# Altium footprint library Inductors SMD.PcbLib: 145 footprints (part 4 of 10)
Each footprint in its own frame and in the unit in brackets; x right, y up, seen from the top. Pads: shape width x height; smd on the part's side, far side on the other; paste and mask are expansions set on the pad; w line width, h text height; cw(c..) or ccw(c..) is an arc to the next point about the centre after c.
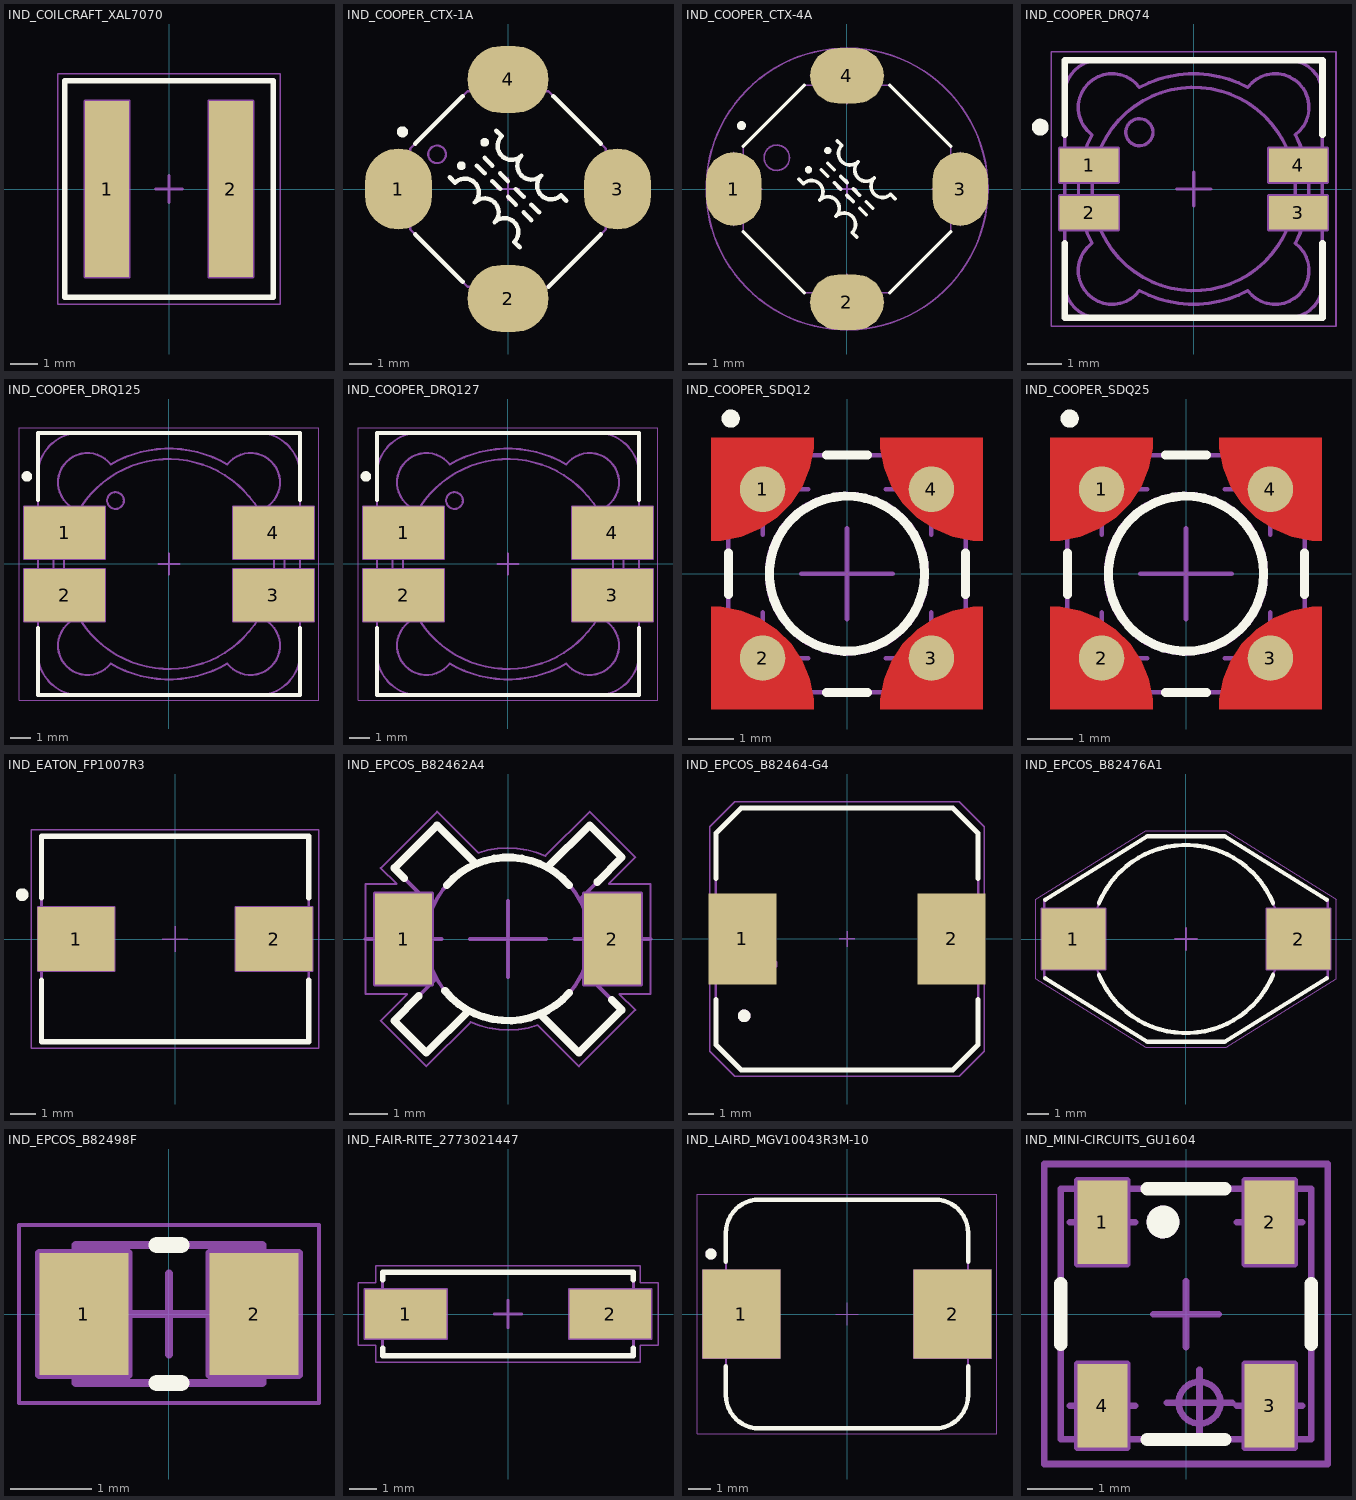
[diagram p3: the footprints below, top view; thin cyan lines are the x and y axes]

## IND_COILCRAFT_XAL7070 [mm] "SMD Inductor Body Width 7.5mm Body Lenght 7.2mm Height 7mm, XAL7070 Series"
height 7
pads (2):
  rect 1.63x6.5 smd: 1(-2.285,0) 2(2.285,0)
Top Overlay:
  lines w0.2: -3.85,-4 3.85,-4 3.85,4 -3.85,4 -3.85,-4
Mechanical 8:
  lines w0.1: -2.785,0 -2.285,0 ; -2.285,-0.5 -2.285,0 ; -2.285,0.5 -2.285,0 ; -1.785,0 -2.285,0 ; -0.5,0 0,0 ; 0,-0.5 0,0 ; 0,0.5 0,0 ; 0.5,0 0,0 ; 1.785,0 2.285,0 ; 2.285,-0.5 2.285,0 ; 2.285,0.5 2.285,0 ; 2.785,0 2.285,0 ; -3.1,-3.25 -3.1,3.25 -1.47,3.25 -1.47,-3.25 -3.1,-3.25 ; 1.47,-3.25 1.47,3.25 3.1,3.25 3.1,-3.25 1.47,-3.25
Mechanical 14:
  lines w0.1: -3.85,-4 3.85,-4 3.85,4 -3.85,4 -3.85,-4
Mechanical 15:
  lines w0.05: -4.1,-4.25 4.1,-4.25 4.1,4.25 -4.1,4.25 -4.1,-4.25
3D body "IND_COILCRAFT_XAL7070.stp": height 7, standoff 0, extent -3.85,-4 3.85,4

## IND_COOPER_CTX-1A [mm] "Dual Winding Shielded Power Inductor/Transformer CTX OCTA-PAC® PLUS Series"
height 4.19
pads (4):
  oval 3.04x3.68 smd: 1(-4.98,0) 3(4.98,0)
  oval 3.68x3.04 smd: 2(0,-4.98) 4(0,4.98)
Top Overlay:
  circle w0.2: c-1.061,2.121 r0.1
  circle w0.2: c-2.121,1.061 r0.1
  circle w0.25: c-4.8,2.6 r0.125
  lines w0.2: -2.652,0.53 -2.408,0.286 cw(c-1.959,-0.163) -1.51,-0.612 cw(c-1.061,-1.061) -0.612,-1.51 cw(c-0.163,-1.959) 0.286,-2.408 0.53,-2.652 ; -1.414,1.061 -1.061,0.707 ; -1.061,1.414 -0.707,1.061 ; -0.707,0.354 -0.354,0 ; -0.53,2.652 -0.286,2.408 ccw(c0.163,1.959) 0.612,1.51 ccw(c1.061,1.061) 1.51,0.612 ccw(c1.959,0.163) 2.408,-0.286 2.652,-0.53 ; -0.354,0.707 0,0.354 ; 0,-0.354 0.354,-0.707 ; 0.354,0 0.707,-0.354 ; 0.707,-1.061 1.061,-1.414 ; 1.061,-0.707 1.414,-1.061 ; -4.225,2.06 -2.06,4.225 -4.225,2.06 ; -4.225,-2.06 -2.06,-4.225 -4.225,-2.06 ; 1.84,-4.445 4.225,-2.06 1.84,-4.445 ; 2.06,4.225 4.225,2.06 2.06,4.225
Mechanical 8:
  lines w0.1: -4.98,0 -5.48,0 -4.98,0 ; -4.98,0 -4.98,0.5 -4.98,0 ; -4.98,0 -4.48,0 -4.98,0 ; -4.98,0 -4.98,-0.5 -4.98,0 ; 0,-4.98 0,-4.48 0,-4.98 ; 0,-4.98 0.5,-4.98 0,-4.98 ; 0,-4.98 0,-5.48 0,-4.98 ; 0,-4.98 -0.5,-4.98 0,-4.98 ; 0,0 0,0.5 0,0 ; 0,0 0.5,0 0,0 ; 0,0 0,-0.5 0,0 ; 0,0 -0.5,0 0,0 ; 0,4.98 0,5.48 0,4.98 ; 0,4.98 0.5,4.98 0,4.98 ; 0,4.98 0,4.48 0,4.98 ; 0,4.98 -0.5,4.98 0,4.98 ; 4.98,0 4.48,0 4.98,0 ; 4.98,0 4.98,0.5 4.98,0 ; 4.98,0 5.48,0 4.98,0 ; 4.98,0 4.98,-0.5 4.98,0
Mechanical 14:
  circle w0.1: c-3.225,1.575 r0.4
  circle w0.1: c-1.061,2.121 r0.1
  circle w0.1: c-2.121,1.061 r0.1
  lines w0.1: -2.652,0.53 -2.408,0.286 cw(c-1.959,-0.163) -1.51,-0.612 cw(c-1.061,-1.061) -0.612,-1.51 cw(c-0.163,-1.959) 0.286,-2.408 0.53,-2.652 ; -1.414,1.061 -1.061,0.707 ; -1.061,1.414 -0.707,1.061 ; -0.707,0.354 -0.354,0 ; -0.53,2.652 -0.286,2.408 ccw(c0.163,1.959) 0.612,1.51 ccw(c1.061,1.061) 1.51,0.612 ccw(c1.959,0.163) 2.408,-0.286 2.652,-0.53 ; -0.354,0.707 0,0.354 ; 0,-0.354 0.354,-0.707 ; 0.354,0 0.707,-0.354 ; 0.707,-1.061 1.061,-1.414 ; 1.061,-0.707 1.414,-1.061 ; -5.715,-0.6 -4.445,-0.6 ; -5.715,-0.6 -5.715,0.6 ; -5.715,-0.6 -4.445,-0.6 ; -5.715,-0.6 -5.715,0.6 ; -5.715,0.6 -4.445,0.6 ; -5.715,0.6 -4.445,0.6 ; -4.445,-1.84 -4.445,1.84 ; -4.445,-1.84 -1.84,-4.445 ; -4.445,-1.84 -4.445,1.84 ; -4.445,-1.84 -1.84,-4.445 ; -4.445,-0.6 -4.445,0.6 ; -4.445,-0.6 -4.445,0.6 ; -4.445,1.84 -1.84,4.445 ; -4.445,1.84 -1.84,4.445 ; -1.84,-4.445 1.84,-4.445 ; -1.84,-4.445 1.84,-4.445 ; -1.84,4.445 1.84,4.445 ; -1.84,4.445 1.84,4.445 ; -0.6,-5.715 -0.6,-4.445 ; -0.6,-5.715 0.6,-5.715 ; -0.6,-5.715 -0.6,-4.445 ; -0.6,-5.715 0.6,-5.715 ; -0.6,-4.445 0.6,-4.445 ; -0.6,-4.445 0.6,-4.445 ; -0.6,4.445 0.6,4.445 ; -0.6,4.445 -0.6,5.715 ; -0.6,4.445 0.6,4.445 ; -0.6,4.445 -0.6,5.715 ; -0.6,5.715 0.6,5.715 ; -0.6,5.715 0.6,5.715 ; 0.6,-5.715 0.6,-4.445 ; 0.6,-5.715 0.6,-4.445 ; 0.6,4.445 0.6,5.715 ; 0.6,4.445 0.6,5.715 ; 1.84,-4.445 4.445,-1.84 ; 1.84,-4.445 4.445,-1.84 ; 1.84,4.445 4.445,1.84 ; 1.84,4.445 4.445,1.84 ; 4.445,-1.84 4.445,1.84 ; 4.445,-1.84 4.445,1.84 ; 4.445,-0.6 5.715,-0.6 ; 4.445,-0.6 4.445,0.6 ; 4.445,-0.6 5.715,-0.6 ; 4.445,-0.6 4.445,0.6 ; 4.445,0.6 5.715,0.6 ; 4.445,0.6 5.715,0.6 ; 5.715,-0.6 5.715,0.6 ; 5.715,-0.6 5.715,0.6
  text "1" at -3.825,-0.575 h1.2
  text "2" at -0.425,-4 h1.2
  text "4" at -0.425,2.75 h1.2
  text "3" at 3.225,-0.65 h1.2
3D body "IND_COOPER_CTX-1A.stp": height 4.19, standoff 0, extent -5.715,-5.715 5.715,5.715

## IND_COOPER_CTX-4A [mm] "Dual Winding Shielded Power Inductor/Transformer CTX OCTA-PAC® PLUS Series"
height 6.35
pads (4):
  oval 3.05x4.06 smd: 1(-6.25,0) 3(6.25,0)
  oval 4.06x3.05 smd: 2(0,-6.25) 4(0,6.25)
Top Overlay:
  circle w0.2: c-1.061,2.121 r0.1
  circle w0.2: c-2.121,1.061 r0.1
  circle w0.25: c-5.825,3.5 r0.125
  lines w0.2: -5.722,-2.36 -2.36,-5.722 ; -5.722,2.36 -2.36,5.722 ; -2.652,0.53 -2.408,0.286 cw(c-1.959,-0.163) -1.51,-0.612 cw(c-1.061,-1.061) -0.612,-1.51 cw(c-0.163,-1.959) 0.286,-2.408 0.53,-2.652 ; -1.414,1.061 -1.061,0.707 ; -1.061,1.414 -0.707,1.061 ; -0.707,0.354 -0.354,0 ; -0.53,2.652 -0.286,2.408 ccw(c0.163,1.959) 0.612,1.51 ccw(c1.061,1.061) 1.51,0.612 ccw(c1.959,0.163) 2.408,-0.286 2.652,-0.53 ; -0.354,0.707 0,0.354 ; 0,-0.354 0.354,-0.707 ; 0.354,0 0.707,-0.354 ; 0.707,-1.061 1.061,-1.414 ; 1.061,-0.707 1.414,-1.061 ; 2.36,-5.722 5.722,-2.36 ; 2.36,5.722 5.722,2.36
Mechanical 8:
  lines w0.1: -7.775,0 -4.725,0 -6.25,0 ; -6.25,-2.03 -6.25,0 ; -6.25,2.03 -6.25,0 ; -2.03,6.25 0,6.25 ; -0.5,0 0,0 ; 0,-7.775 0,-6.25 ; 0,-4.725 0,-6.25 ; 0,-0.5 0,0 ; 0,0.5 0,0 ; 0,4.725 0,6.25 ; 0,7.775 0,6.25 ; 0.5,0 0,0 ; 2.03,-6.25 -2.03,-6.25 0,-6.25 ; 2.03,6.25 0,6.25 ; 4.725,0 6.25,0 ; 6.25,-2.03 6.25,0 ; 6.25,2.03 6.25,0 ; 7.775,0 6.25,0
Mechanical 14:
  circle w0.1: c-3.875,1.725 r0.7
  circle w0.1: c-1.061,2.121 r0.1
  circle w0.1: c-2.121,1.061 r0.1
  lines w0.1: -5.722,-1.18 -7.285,-1.18 -7.285,1.18 -5.722,1.18 ; -2.652,0.53 -2.408,0.286 cw(c-1.959,-0.163) -1.51,-0.612 cw(c-1.061,-1.061) -0.612,-1.51 cw(c-0.163,-1.959) 0.286,-2.408 0.53,-2.652 ; -1.414,1.061 -1.061,0.707 ; -1.18,-5.722 -1.18,-7.285 1.18,-7.285 1.18,-5.722 ; -1.18,5.722 -1.18,7.285 1.18,7.285 1.18,5.722 ; -1.061,1.414 -0.707,1.061 ; -0.707,0.354 -0.354,0 ; -0.53,2.652 -0.286,2.408 ccw(c0.163,1.959) 0.612,1.51 ccw(c1.061,1.061) 1.51,0.612 ccw(c1.959,0.163) 2.408,-0.286 2.652,-0.53 ; -0.354,0.707 0,0.354 ; 0,-0.354 0.354,-0.707 ; 0.354,0 0.707,-0.354 ; 0.707,-1.061 1.061,-1.414 ; 1.061,-0.707 1.414,-1.061 ; 5.722,-1.18 7.285,-1.18 7.285,1.18 5.722,1.18 ; -5.722,-2.36 -2.36,-5.722 2.36,-5.722 5.722,-2.36 5.722,2.36 2.36,5.722 -2.36,5.722 -5.722,2.36 -5.722,-2.36
  text "1" at -3.825,-0.575 h1.2
  text "2" at -0.425,-4 h1.2
  text "4" at -0.425,2.75 h1.2
  text "3" at 3.225,-0.65 h1.2
Mechanical 15:
  circle w0.1: c0,0 r7.775
3D body "IND_COOPER_CTX-4A.stp": height 6.35, standoff 0, extent -7.285,-7.285 7.285,7.285

## IND_COOPER_DRQ74 [mm] "Dual Winding Shielded Inductor/Transformer DRQ Series"
height 4.45
pads (4):
  rect 1.73x1 smd: 1(-3.085,0.7) 2(-3.085,-0.7) 3(3.085,-0.7) 4(3.085,0.7)
Top Overlay:
  circle w0.25: c-4.525,1.825 r0.125
  lines w0.2: -3.8,-1.6 -3.8,-3.8 3.8,-3.8 3.8,-1.6 ; -3.8,1.6 -3.8,3.8 3.8,3.8 3.8,1.6
Mechanical 8:
  lines w0.1: -3.585,-0.7 -3.085,-0.7 ; -3.585,0.7 -3.085,0.7 ; -3.085,-1.2 -3.085,-0.7 ; -3.085,-0.2 -3.085,-0.7 ; -3.085,0.2 -3.085,0.7 ; -3.085,1.2 -3.085,0.7 ; -2.585,-0.7 -3.085,-0.7 ; -2.585,0.7 -3.085,0.7 ; -0.5,0 0,0 ; 0,-0.5 0,0 ; 0,0.5 0,0 ; 0.5,0 0,0 ; 2.585,-0.7 3.085,-0.7 ; 2.585,0.7 3.085,0.7 ; 3.085,-1.2 3.085,-0.7 ; 3.085,-0.2 3.085,-0.7 ; 3.085,0.2 3.085,0.7 ; 3.085,1.2 3.085,0.7 ; 3.585,-0.7 3.085,-0.7 ; 3.585,0.7 3.085,0.7 ; -3.95,-1.2 -3.95,-0.2 -2.22,-0.2 -2.22,-1.2 -3.95,-1.2 ; -3.95,0.2 -3.95,1.2 -2.22,1.2 -2.22,0.2 -3.95,0.2 ; 2.22,-1.2 2.22,-0.2 3.95,-0.2 3.95,-1.2 2.22,-1.2 ; 2.22,0.2 2.22,1.2 3.95,1.2 3.95,0.2 2.22,0.2
Mechanical 14:
  circle w0.1: c-1.6,1.675 r0.4
  circle w0.1: c0,0 r3
  lines w0.1: -3.8,-2.8 ccw(c-2.8,-2.8) -2.8,-3.8 2.8,-3.8 ccw(c2.8,-2.8) 3.8,-2.8 3.8,2.8 ccw(c2.8,2.8) 2.8,3.8 -2.8,3.8 ccw(c-2.8,2.8) -3.8,2.8 -3.8,-2.8 ; -3,-1.601 cw(c0,0) -3,1.601 cw(c-2.404,2.404) -1.601,3 cw(c0,0) 1.601,3 cw(c2.404,2.404) 3,1.601 cw(c0,0) 3,-1.601 cw(c2.404,-2.404) 1.601,-3 cw(c0,0) -1.601,-3 cw(c-2.404,-2.404) -3,-1.601
Mechanical 15:
  lines w0.05: -4.2,-4.05 4.2,-4.05 4.2,4.05 -4.2,4.05 -4.2,-4.05
3D body "IND_COOPER_DRQ74.stp": height 4.45, standoff 0, extent -3.8,-3.8 3.8,3.8

## IND_COOPER_DRQ125 [mm] "Dual Winding Shielded Inductor/Transformer DRQ Series"
height 6
pads (4):
  rect 3.85x2.5 smd: 1(-4.975,1.5) 2(-4.975,-1.5) 3(4.975,-1.5) 4(4.975,1.5)
Top Overlay:
  circle w0.25: c-6.775,4.175 r0.125
  lines w0.2: -6.25,-3.05 -6.25,-6.25 6.25,-6.25 6.25,-3.05 ; -6.25,3.05 -6.25,6.25 6.25,6.25 6.25,3.05
Mechanical 8:
  lines w0.1: -5.475,-1.5 -4.975,-1.5 ; -5.475,1.5 -4.975,1.5 ; -4.975,-2 -4.975,-1.5 ; -4.975,-1 -4.975,-1.5 ; -4.975,1 -4.975,1.5 ; -4.975,2 -4.975,1.5 ; -4.475,-1.5 -4.975,-1.5 ; -4.475,1.5 -4.975,1.5 ; -0.5,0 0,0 ; 0,-0.5 0,0 ; 0,0.5 0,0 ; 0.5,0 0,0 ; 4.475,1.5 4.975,1.5 ; 4.975,1 4.975,1.5 ; 4.975,2 4.975,1.5 ; 5.475,1.5 4.975,1.5 ; -6.9,-2.75 -3.05,-2.75 -3.05,-0.25 -6.9,-0.25 -6.9,-2.75 ; -6.9,0.25 -3.05,0.25 -3.05,2.75 -6.9,2.75 -6.9,0.25 ; 3.05,-2.75 6.9,-2.75 6.9,-0.25 3.05,-0.25 3.05,-2.75 ; 3.05,0.25 6.9,0.25 6.9,2.75 3.05,2.75 3.05,0.25
Mechanical 14:
  circle w0.1: c0,0 r5
  circle w0.1: c-2.55,3.025 r0.4
  lines w0.1: -4.25,6.25 ccw(c-4.25,4.25) -6.25,4.25 -6.25,-4.25 ccw(c-4.25,-4.25) -4.25,-6.25 4.25,-6.25 ccw(c4.25,-4.25) 6.25,-4.25 6.25,4.25 ccw(c4.25,4.25) 4.25,6.25 ; -4.25,6.25 4.25,6.25 ; -4.25,6.25 4.25,6.25 ; -4.745,-2.781 ccw(c-3.889,-3.889) -2.781,-4.745 ccw(c0,0) 2.781,-4.745 ccw(c3.889,-3.889) 4.745,-2.781 ccw(c0,0) 4.745,2.781 ccw(c3.889,3.889) 2.781,4.745 ccw(c0,0) -2.781,4.745 ccw(c-3.889,3.889) -4.745,2.781 ccw(c0,0) -4.745,-2.781
Mechanical 15:
  lines w0.05: -7.15,-6.5 7.15,-6.5 7.15,6.5 -7.15,6.5 -7.15,-6.5
3D body "IND_COOPER_DRQ125.stp": height 6, standoff 0, extent -6.25,-6.25 6.25,6.25

## IND_COOPER_DRQ127 [mm] "Dual Winding Shielded Inductor/Transformer DRQ Series"
height 8
pads (4):
  rect 3.85x2.5 smd: 1(-4.975,1.5) 2(-4.975,-1.5) 3(4.975,-1.5) 4(4.975,1.5)
Top Overlay:
  circle w0.25: c-6.775,4.175 r0.125
  lines w0.2: -6.25,-3.05 -6.25,-6.25 6.25,-6.25 6.25,-3.05 ; -6.25,3.05 -6.25,6.25 6.25,6.25 6.25,3.05
Mechanical 8:
  lines w0.1: -5.475,-1.5 -4.975,-1.5 ; -5.475,1.5 -4.975,1.5 ; -4.975,-2 -4.975,-1.5 ; -4.975,-1 -4.975,-1.5 ; -4.975,1 -4.975,1.5 ; -4.975,2 -4.975,1.5 ; -4.475,-1.5 -4.975,-1.5 ; -4.475,1.5 -4.975,1.5 ; -0.5,0 0,0 ; 0,-0.5 0,0 ; 0,0.5 0,0 ; 0.5,0 0,0 ; 4.475,1.5 4.975,1.5 ; 4.975,1 4.975,1.5 ; 4.975,2 4.975,1.5 ; 5.475,1.5 4.975,1.5 ; -6.9,-2.75 -3.05,-2.75 -3.05,-0.25 -6.9,-0.25 -6.9,-2.75 ; -6.9,0.25 -3.05,0.25 -3.05,2.75 -6.9,2.75 -6.9,0.25 ; 3.05,-2.75 6.9,-2.75 6.9,-0.25 3.05,-0.25 3.05,-2.75 ; 3.05,0.25 6.9,0.25 6.9,2.75 3.05,2.75 3.05,0.25
Mechanical 14:
  circle w0.1: c0,0 r5
  circle w0.1: c-2.55,3.025 r0.4
  lines w0.1: -4.25,6.25 ccw(c-4.25,4.25) -6.25,4.25 -6.25,-4.25 ccw(c-4.25,-4.25) -4.25,-6.25 4.25,-6.25 ccw(c4.25,-4.25) 6.25,-4.25 6.25,4.25 ccw(c4.25,4.25) 4.25,6.25 ; -4.25,6.25 4.25,6.25 ; -4.25,6.25 4.25,6.25 ; -4.745,-2.781 ccw(c-3.889,-3.889) -2.781,-4.745 ccw(c0,0) 2.781,-4.745 ccw(c3.889,-3.889) 4.745,-2.781 ccw(c0,0) 4.745,2.781 ccw(c3.889,3.889) 2.781,4.745 ccw(c0,0) -2.781,4.745 ccw(c-3.889,3.889) -4.745,2.781 ccw(c0,0) -4.745,-2.781
Mechanical 15:
  lines w0.05: -7.15,-6.5 7.15,-6.5 7.15,6.5 -7.15,6.5 -7.15,-6.5
3D body "IND_COOPER_DRQ127.stp": height 8, standoff 0, extent -6.25,-6.25 6.25,6.25

## IND_COOPER_SDQ12 [mm] "Low-Profile Dual Winding Shielded Inductor/Transformer SDQ Series"
height 1.2
pads (4):
  round 1 smd: 1(-1.85,1.85) 2(-1.85,-1.85) 3(1.85,-1.85) 4(1.85,1.85)
Top Layer:
  region: -2.975,-2.975 -0.725,-2.975 -0.725,-2.753 -0.811,-2.319 -0.981,-1.909 -1.227,-1.541 -1.541,-1.227 -1.909,-0.981 -2.319,-0.811 -2.753,-0.725 -2.975,-0.725
  region: 2.975,2.975 0.725,2.975 0.725,2.753 0.811,2.319 0.981,1.909 1.227,1.541 1.541,1.227 1.909,0.981 2.319,0.811 2.753,0.725 2.975,0.725
  region: 2.975,-2.975 2.975,-0.725 2.753,-0.725 2.319,-0.811 1.909,-0.981 1.541,-1.227 1.227,-1.541 0.981,-1.909 0.811,-2.319 0.725,-2.753 0.725,-2.975
  region: -2.975,2.975 -2.975,0.725 -2.753,0.725 -2.319,0.811 -1.909,0.981 -1.541,1.227 -1.227,1.541 -0.981,1.909 -0.811,2.319 -0.725,2.753 -0.725,2.975
Top Overlay:
  circle w0.2: c0,0 r1.7
  circle w0.2: c-2.55,3.4 r0.1
  lines w0.2: -2.6,-0.453 -2.6,0.453 ; -0.453,-2.6 0.453,-2.6 ; -0.453,2.6 0.453,2.6 ; 2.6,-0.453 2.6,0.453
Top Paste:
  region: -2.975,2.975 -2.975,0.725 -2.753,0.725 -2.319,0.811 -1.909,0.981 -1.541,1.227 -1.227,1.541 -0.981,1.909 -0.811,2.319 -0.725,2.753 -0.725,2.975
  region: 2.975,2.975 0.725,2.975 0.725,2.753 0.811,2.319 0.981,1.909 1.227,1.541 1.541,1.227 1.909,0.981 2.319,0.811 2.753,0.725 2.975,0.725
  region: -2.975,-2.975 -0.725,-2.975 -0.725,-2.753 -0.811,-2.319 -0.981,-1.909 -1.227,-1.541 -1.541,-1.227 -1.909,-0.981 -2.319,-0.811 -2.753,-0.725 -2.975,-0.725
  region: 2.975,-2.975 2.975,-0.725 2.753,-0.725 2.319,-0.811 1.909,-0.981 1.541,-1.227 1.227,-1.541 0.981,-1.909 0.811,-2.319 0.725,-2.753 0.725,-2.975
Top Solder:
  region: 0.627,-3.075 0.617,-2.831 0.697,-2.35 0.874,-1.895 1.141,-1.486 1.486,-1.141 1.895,-0.874 2.35,-0.697 2.831,-0.617 3.075,-0.627 3.075,-3.075
  region: 3.075,0.627 2.831,0.617 2.35,0.697 1.895,0.874 1.486,1.141 1.141,1.486 0.874,1.895 0.697,2.35 0.617,2.831 0.627,3.075 3.075,3.075
  region: -3.075,-0.627 -2.831,-0.617 -2.35,-0.697 -1.895,-0.874 -1.486,-1.141 -1.141,-1.486 -0.874,-1.895 -0.697,-2.35 -0.617,-2.831 -0.627,-3.075 -3.075,-3.075
  region: -0.627,3.075 -0.617,2.831 -0.697,2.35 -0.874,1.895 -1.141,1.486 -1.486,1.141 -1.895,0.874 -2.35,0.697 -2.831,0.617 -3.075,0.627 -3.075,3.075
Mechanical 8:
  lines w0.1: -2.85,-1.85 -1.85,-1.85 ; -2.85,1.85 -1.85,1.85 ; -1.85,-2.85 -1.85,-1.85 ; -1.85,-0.85 -1.85,-1.85 ; -1.85,0.85 -1.85,1.85 ; -1.85,2.85 -1.85,1.85 ; -1,0 0,0 ; -0.85,-1.85 -1.85,-1.85 ; -0.85,1.85 -1.85,1.85 ; 0,-1 0,0 ; 0,1 0,0 ; 0.85,-1.85 1.85,-1.85 ; 0.85,1.85 1.85,1.85 ; 1,0 0,0 ; 1.85,-2.85 1.85,-1.85 ; 1.85,-0.85 1.85,-1.85 ; 1.85,0.85 1.85,1.85 ; 1.85,2.85 1.85,1.85 ; 2.85,-1.85 1.85,-1.85 ; 2.85,1.85 1.85,1.85
Mechanical 14:
  circle w0.1: c0,0 r1.75
  circle w0.1: c-2.55,3.4 r0.1
  lines w0.1: -2.6,-2.6 -2.6,2.6 2.6,2.6 2.6,-2.6 -2.6,-2.6
3D body "IND_COOPER_SDQ12.stp": height 1.2, standoff 0, extent -2.6,-2.6 2.6,2.6

## IND_COOPER_SDQ25 [mm] "Low-Profile Dual Winding Shielded Inductor/Transformer SDQ Series"
height 2.5
pads (4):
  round 1 smd: 1(-1.85,1.85) 2(-1.85,-1.85) 3(1.85,-1.85) 4(1.85,1.85)
Top Layer:
  region: -2.975,2.975 -2.975,0.725 -2.753,0.725 -2.319,0.811 -1.909,0.981 -1.541,1.227 -1.227,1.541 -0.981,1.909 -0.811,2.319 -0.725,2.753 -0.725,2.975
  region: 2.975,-2.975 2.975,-0.725 2.753,-0.725 2.319,-0.811 1.909,-0.981 1.541,-1.227 1.227,-1.541 0.981,-1.909 0.811,-2.319 0.725,-2.753 0.725,-2.975
  region: 2.975,2.975 0.725,2.975 0.725,2.753 0.811,2.319 0.981,1.909 1.227,1.541 1.541,1.227 1.909,0.981 2.319,0.811 2.753,0.725 2.975,0.725
  region: -2.975,-2.975 -0.725,-2.975 -0.725,-2.753 -0.811,-2.319 -0.981,-1.909 -1.227,-1.541 -1.541,-1.227 -1.909,-0.981 -2.319,-0.811 -2.753,-0.725 -2.975,-0.725
Top Overlay:
  circle w0.2: c-2.55,3.4 r0.1
  circle w0.2: c0,0 r1.7
  lines w0.2: -2.6,-0.453 -2.6,0.453 ; -0.453,-2.6 0.453,-2.6 ; -0.453,2.6 0.453,2.6 ; 2.6,-0.453 2.6,0.453
Top Paste:
  region: 2.975,-2.975 2.975,-0.725 2.753,-0.725 2.319,-0.811 1.909,-0.981 1.541,-1.227 1.227,-1.541 0.981,-1.909 0.811,-2.319 0.725,-2.753 0.725,-2.975
  region: -2.975,-2.975 -0.725,-2.975 -0.725,-2.753 -0.811,-2.319 -0.981,-1.909 -1.227,-1.541 -1.541,-1.227 -1.909,-0.981 -2.319,-0.811 -2.753,-0.725 -2.975,-0.725
  region: 2.975,2.975 0.725,2.975 0.725,2.753 0.811,2.319 0.981,1.909 1.227,1.541 1.541,1.227 1.909,0.981 2.319,0.811 2.753,0.725 2.975,0.725
  region: -2.975,2.975 -2.975,0.725 -2.753,0.725 -2.319,0.811 -1.909,0.981 -1.541,1.227 -1.227,1.541 -0.981,1.909 -0.811,2.319 -0.725,2.753 -0.725,2.975
Top Solder:
  region: -0.627,3.075 -0.617,2.831 -0.697,2.35 -0.874,1.895 -1.141,1.486 -1.486,1.141 -1.895,0.874 -2.35,0.697 -2.831,0.617 -3.075,0.627 -3.075,3.075
  region: -3.075,-0.627 -2.831,-0.617 -2.35,-0.697 -1.895,-0.874 -1.486,-1.141 -1.141,-1.486 -0.874,-1.895 -0.697,-2.35 -0.617,-2.831 -0.627,-3.075 -3.075,-3.075
  region: 3.075,0.627 2.831,0.617 2.35,0.697 1.895,0.874 1.486,1.141 1.141,1.486 0.874,1.895 0.697,2.35 0.617,2.831 0.627,3.075 3.075,3.075
  region: 0.627,-3.075 0.617,-2.831 0.697,-2.35 0.874,-1.895 1.141,-1.486 1.486,-1.141 1.895,-0.874 2.35,-0.697 2.831,-0.617 3.075,-0.627 3.075,-3.075
Mechanical 8:
  lines w0.1: -2.85,-1.85 -1.85,-1.85 ; -2.85,1.85 -1.85,1.85 ; -1.85,-2.85 -1.85,-1.85 ; -1.85,-0.85 -1.85,-1.85 ; -1.85,0.85 -1.85,1.85 ; -1.85,2.85 -1.85,1.85 ; -1,0 0,0 ; -0.85,-1.85 -1.85,-1.85 ; -0.85,1.85 -1.85,1.85 ; 0,-1 0,0 ; 0,1 0,0 ; 0.85,-1.85 1.85,-1.85 ; 0.85,1.85 1.85,1.85 ; 1,0 0,0 ; 1.85,-2.85 1.85,-1.85 ; 1.85,-0.85 1.85,-1.85 ; 1.85,0.85 1.85,1.85 ; 1.85,2.85 1.85,1.85 ; 2.85,-1.85 1.85,-1.85 ; 2.85,1.85 1.85,1.85
Mechanical 14:
  circle w0.1: c-2.55,3.4 r0.1
  circle w0.1: c0,0 r1.75
  lines w0.1: -2.6,-2.6 2.6,-2.6 2.6,2.6 -2.6,2.6 -2.6,-2.6
3D body "IND_COOPER_SDQ25.stp": height 2.5, standoff 0, extent -2.6,-2.6 2.6,2.6

## IND_EATON_FP1007R3 [mm] "High Frequency, High Current Power Inductors, FP1007(R3) Series"
height 7.5
pads (2):
  rect 3x2.5 smd: 1(-3.85,0) 2(3.85,0)
Top Overlay:
  circle w0.25: c-5.95,1.725 r0.125
  lines w0.2: -5.2,-1.6 -5.2,-4 5.2,-4 5.2,-1.6 ; -5.2,1.6 -5.2,4 5.2,4 5.2,1.6
Mechanical 8:
  lines w0.05: -4.35,0 -3.85,0 ; -3.85,-0.5 -3.85,0 ; -3.85,0.5 -3.85,0 ; -3.35,0 -3.85,0 ; -0.5,0 0,0 ; 0,-0.5 0,0 ; 0,0.5 0,0 ; 0.5,0 0,0 ; 3.35,0 3.85,0 ; 3.85,-0.5 3.85,0 ; 3.85,0.5 3.85,0 ; 4.35,0 3.85,0 ; -5.35,-1.25 -2.35,-1.25 -2.35,1.25 -5.35,1.25 -5.35,-1.25 ; 2.35,-1.25 2.35,1.25 5.35,1.25 5.35,-1.25 2.35,-1.25
Mechanical 14:
  lines w0.1: -5.2,-4 -5.2,4 5.2,4 5.2,-4 -5.2,-4
Mechanical 15:
  lines w0.05: -5.6,-4.25 -5.6,4.25 5.6,4.25 5.6,-4.25 -5.6,-4.25
3D body "IND_EATON_FP1007R3.stp": height 7.5, standoff 0, extent -5.2,-4 5.2,4

## IND_EPCOS_B82462A4 [mm] "SMD Inductor Body Width 6mm Body Lenght 6mm Height 3mm"
height 3
pads (2):
  rect 1.5x2.4 smd: 1(-2.75,0) 2(2.75,0)
Top Overlay:
  lines w0.2: -2.731,1.6 -3,1.869 -1.869,3 -0.845,1.977 ; -2.349,-1.501 -3,-2.151 -2.151,-3 -1.036,-1.884 ; -1.66,-1.367 ccw(c0,0) 1.618,-1.416 ; -1.618,1.416 cw(c0,0) 1.618,1.416 ; 0.845,-1.977 1.869,-3 3,-1.869 2.731,-1.6 ; 1.036,1.884 2.151,3 3,2.151 2.349,1.501
Mechanical 8:
  lines w0.1: -3.75,0 -2.75,0 ; -2.75,-1 -2.75,0 ; -2.75,1 -2.75,0 ; -1.75,0 -2.75,0 ; -1,0 0,0 ; 0,-1 0,0 ; 0,1 0,0 ; 1,0 0,0 ; 1.75,0 2.75,0 ; 2.75,-1 2.75,0 ; 2.75,1 2.75,0 ; 3.75,0 2.75,0 ; -3.5,-1.2 -3.5,1.2 -2,1.2 -2,-1.2 -3.5,-1.2 ; 2,-1.2 2,1.2 3.5,1.2 3.5,-1.2 2,-1.2
Mechanical 14:
  circle w0.1: c0,0 r2.15
  lines w0.1: -1.036,-1.884 -2.151,-3 -3,-2.151 -1.884,-1.036 -1.903,-1 -3,-1 -3,1 -2.131,1 -3,1.869 -1.869,3 -0.845,1.977 ; 0.845,-1.977 1.869,-3 3,-1.869 2.131,-1 3,-1 3,1 1.903,1 1.884,1.036 3,2.151 2.151,3 1.036,1.884
Mechanical 15:
  lines w0.05: -3.75,-1.45 -2.652,-1.45 -3.354,-2.151 -2.151,-3.354 -0.986,-2.188 ccw(c0,0) 0.784,-2.268 1.869,-3.354 3.354,-1.869 2.935,-1.45 3.75,-1.45 3.75,1.45 2.652,1.45 3.354,2.151 2.151,3.354 0.986,2.188 ccw(c0,0) -0.784,2.268 -1.869,3.354 -3.354,1.869 -2.935,1.45 -3.75,1.45 -3.75,-1.45
3D body "IND_EPCOS_B82462A4.stp": height 3, standoff 0, extent -3,-3 3,3

## IND_EPCOS_B82464-G4 [mm] "SMD Inductor Body Width 10.4mm Body Lenght 10.4mm Height 4.8mm"
height 4.8
pads (2):
  rect 2.7x3.6 smd: 1(-4.15,0) 2(4.15,0)
Top Overlay:
  circle w0.25: c-4.075,-3.05 r0.125
  lines w0.2: -5.2,-2.4 -5.2,-4.2 -4.2,-5.2 4.2,-5.2 5.2,-4.2 5.2,-2.4 ; -5.2,2.4 -5.2,4.2 -4.2,5.2 4.2,5.2 5.2,4.2 5.2,2.4
Mechanical 14:
  circle w0.25: c-4.075,-3.05 r0.125
  circle w0.25: c-3,-1 r0.125
  lines w0.1: -5.2,-4.2 -4.2,-5.2 4.2,-5.2 5.2,-4.2 5.2,4.2 4.2,5.2 -4.2,5.2 -5.2,4.2 -5.2,-4.2
Mechanical 15:
  lines w0.05: -0.3,0 0.3,0 ; 0,-0.3 0,0.3 ; -5.45,-4.45 -4.45,-5.45 4.45,-5.45 5.45,-4.45 5.45,4.45 4.45,5.45 -4.45,5.45 -5.45,4.45 -5.45,-4.45
3D body "IND_EPCOS_B82464-G4.stp": height 4.9, standoff 0, extent -5.201,-5.201 5.199,5.199

## IND_EPCOS_B82476A1 [mm] "SMD Inductor Body Width 9.4mm Body Lenght 12.95mm Height 5.08mm"
height 5.08
pads (2):
  rect 2.92x2.79 smd: 1(-5.145,0) 2(5.145,0)
Top Overlay:
  lines w0.2: -6.435,-1.795 -1.77,-4.7 1.77,-4.7 6.435,-1.795 ; -6.435,1.795 -1.77,4.7 1.77,4.7 6.435,1.795 ; -3.974,-1.642 ccw(c0,0) 3.974,-1.642 ; -3.974,1.642 cw(c0,0) 3.974,1.642
Mechanical 8:
  lines w0.1: -5.645,0 -5.145,0 ; -5.145,-0.5 -5.145,0 ; -5.145,0.5 -5.145,0 ; -4.645,0 -5.145,0 ; -0.5,0 0,0 ; 0,-0.5 0,0 ; 0,0.5 0,0 ; 0.5,0 0,0 ; 4.645,0 5.145,0 ; 5.145,-0.5 5.145,0 ; 5.145,0.5 5.145,0 ; 5.645,0 5.145,0 ; -6.605,-1.395 -3.685,-1.395 -3.685,1.395 -6.605,1.395 -6.605,-1.395 ; 3.685,-1.395 6.605,-1.395 6.605,1.395 3.685,1.395 3.685,-1.395
Mechanical 14:
  circle w0.1: c0,0 r4.3
  lines w0.1: -6.475,-1.27 -4.108,-1.27 ; -6.475,1.27 -4.108,1.27 ; 4.108,-1.27 6.475,-1.27 ; 4.108,1.27 6.475,1.27 ; -6.475,-1.77 -6.475,1.77 -1.77,4.7 1.77,4.7 6.475,1.77 6.475,-1.77 1.77,-4.7 -1.77,-4.7 -6.475,-1.77
Mechanical 15:
  lines w0.05: -6.855,-1.828 -6.855,1.828 -1.841,4.95 1.842,4.95 6.855,1.828 6.855,-1.828 1.842,-4.95 -1.841,-4.95 -6.855,-1.828
3D body "IND_EPCOS_B82476A1.stp": height 5.08, standoff 0, extent -6.475,-4.7 6.475,4.7

## IND_EPCOS_B82498F [mm] "SMT inductor SIMID 0805-F, Body Width 1.7mm Body Lenght 2.3mm Height 1.4mm"
height 1.4
pads (2):
  rect 1.1x1.5 smd: 1(-1.05,0) 2(1.05,0)
Top Overlay:
  lines w0.2: -0.15,-0.85 0.15,-0.85 ; -0.15,0.85 0.15,0.85
Mechanical 8:
  lines w0.1: -1.55,0 -1.05,0 ; -1.05,-0.5 -1.05,0 ; -1.05,0.5 -1.05,0 ; -0.55,0 -1.05,0 ; -0.5,0 0,0 ; 0,-0.5 0,0 ; 0,0.5 0,0 ; 0.5,0 0,0 ; 0.55,0 1.05,0 ; 1.05,-0.5 1.05,0 ; 1.05,0.5 1.05,0 ; 1.55,0 1.05,0 ; -1.6,-0.75 -1.6,0.75 -0.5,0.75 -0.5,-0.75 -1.6,-0.75 ; 0.5,-0.75 0.5,0.75 1.6,0.75 1.6,-0.75 0.5,-0.75
Mechanical 14:
  lines w0.1: -1.15,-0.85 -1.15,0.85 1.15,0.85 1.15,-0.85 -1.15,-0.85
Mechanical 15:
  lines w0.05: -1.85,-1.1 1.85,-1.1 1.85,1.1 -1.85,1.1 -1.85,-1.1
3D body "IND_EPCOS_B82498F_Part2.stp": height 1.4, standoff 0.6, extent -1.15,-0.85 1.15,0.85
3D body "IND_EPCOS_B82498F_Part1.stp": height 1.2, standoff 0, extent -1,-0.75 1,0.75

## IND_FAIR-RITE_2773021447 [mm] "SMD Ferrite Bead, Body 9.6x3.05mm"
height 3.05
pads (2):
  rect 3x1.8 smd: 1(-3.75,0) 2(3.75,0)
Top Overlay:
  lines w0.2: -4.6,-1.25 -4.6,-1.525 4.6,-1.525 4.6,-1.25 ; -4.6,1.25 -4.6,1.525 4.6,1.525 4.6,1.25
Mechanical 8:
  lines w0.1: -4.25,0 -3.75,0 ; -3.75,-0.5 -3.75,0 ; -3.75,0.5 -3.75,0 ; -3.25,0 -3.75,0 ; -0.5,0 0,0 ; 0,-0.5 0,0 ; 0,0.5 0,0 ; 0.5,0 0,0 ; 3.25,0 3.75,0 ; 3.75,-0.5 3.75,0 ; 3.75,0.5 3.75,0 ; 4.25,0 3.75,0 ; -5.25,-0.9 -2.25,-0.9 -2.25,0.9 -5.25,0.9 -5.25,-0.9 ; 2.25,-0.9 5.25,-0.9 5.25,0.9 2.25,0.9 2.25,-0.9
Mechanical 14:
  lines w0.1: -4.6,-0.635 -4.8,-0.635 -4.8,0.635 -4.6,0.635 ; 4.6,-0.635 4.8,-0.635 4.8,0.635 4.6,0.635 ; -4.6,-1.525 -4.6,1.525 ; -4.6,-1.525 4.6,-1.525 ; -4.6,-1.525 4.6,-1.525 ; -4.6,1.525 4.6,1.525 ; -4.6,1.525 4.6,1.525 ; 4.6,-1.525 4.6,1.525
Mechanical 15:
  lines w0.05: -5.5,-1.15 -4.85,-1.15 -4.85,-1.775 4.85,-1.775 4.85,-1.15 5.5,-1.15 5.5,1.15 4.85,1.15 4.85,1.775 -4.85,1.775 -4.85,1.15 -5.5,1.15 -5.5,-1.15
3D body "IND_FAIR-RITE_2773021447.stp": height 3.05, standoff 0, extent -4.8,-1.525 4.8,1.525

## IND_LAIRD_MGV10043R3M-10 [mm] "SMD Inductor Body Width 11.5mm Body Lenght 10.3mm Height 4.3mm"
height 4.3
pads (2):
  rect 3.5x4 smd: 1(-4.75,0) 2(4.75,0)
Top Overlay:
  circle w0.25: c-6.125,2.7 r0.125
  lines w0.2: -5.45,-2.35 -5.45,-3.65 ccw(c-3.95,-3.65) -3.95,-5.15 3.95,-5.15 ccw(c3.95,-3.65) 5.45,-3.65 5.45,-2.35 ; -5.45,2.35 -5.45,3.65 cw(c-3.95,3.65) -3.95,5.15 3.95,5.15 cw(c3.95,3.65) 5.45,3.65 5.45,2.35
Mechanical 8:
  lines w0.05: -0.5,0 0,0 ; 0,-0.5 0,0 ; 0,0.5 0,0 ; 0.5,0 0,0 ; -6.5,-2 -4.75,0 -6.5,2 ; -6.5,-2 -6.5,2 ; -6.5,-2 -3,-2 -3,2 -6.5,2 ; 6.5,-2 4.75,0 6.5,2 ; 6.5,-2 3,-2 3,2 6.5,2 ; 6.5,-2 6.5,2
Mechanical 14:
  circle w0.1: c-6.125,2.7 r0.2
  lines w0.1: -5.45,-1.7 -5.75,-1.7 -5.75,1.7 -5.45,1.7 ; 5.45,-1.7 5.75,-1.7 5.75,1.7 5.45,1.7 ; -5.45,-3.65 ccw(c-3.95,-3.65) -3.95,-5.15 3.95,-5.15 ccw(c3.95,-3.65) 5.45,-3.65 5.45,3.65 ccw(c3.95,3.65) 3.95,5.15 -3.95,5.15 ccw(c-3.95,3.65) -5.45,3.65 -5.45,-3.65
Mechanical 15:
  lines w0.05: -6.75,-5.4 6.75,-5.4 6.75,5.4 -6.75,5.4 -6.75,-5.4
3D body "IND_LAIRD_MGV10043R3M-10.stp": height 4.3, standoff 0, extent -5.75,-5.15 5.75,5.15

## IND_MINI-CIRCUITS_GU1604 [mm] "MINI-CIRCUITS RF Choke, Case GU1041 - Body 3.81X3.81mm"
height 3.81
pads (4):
  rect 0.76x1.27 smd: 1(-1.27,1.394) 2(1.27,1.396) 3(1.27,-1.394) 4(-1.27,-1.396)
Top Overlay:
  circle w0.25: c-0.35,1.4 r0.125
  lines w0.2: -1.905,-0.459 -1.905,0.461 ; -0.59,-1.905 0.59,-1.905 ; -0.59,1.905 0.59,1.905 ; 1.905,-0.459 1.905,0.461
Mechanical 8:
  circle w0.1: c0.205,-1.347 r0.318
  lines w0.1: -1.77,-1.396 -1.27,-1.396 ; -1.77,1.394 -1.27,1.394 ; -1.27,-1.896 -1.27,-1.396 ; -1.27,-0.896 -1.27,-1.396 ; -1.27,0.894 -1.27,1.394 ; -1.27,1.894 -1.27,1.394 ; -0.77,-1.396 -1.27,-1.396 ; -0.77,1.394 -1.27,1.394 ; -0.295,-1.347 0.205,-1.347 ; 0.205,-1.847 0.205,-1.347 ; 0.205,-0.847 0.205,-1.347 ; 0.705,-1.347 0.205,-1.347 ; 0.77,-1.394 1.27,-1.394 ; 0.77,1.396 1.27,1.396 ; 1.27,-1.894 1.27,-1.394 ; 1.27,-0.894 1.27,-1.394 ; 1.27,0.896 1.27,1.396 ; 1.27,1.896 1.27,1.396 ; 1.77,-1.394 1.27,-1.394 ; 1.77,1.396 1.27,1.396 ; 0,0 0,0.5 0,0 ; 0,0 0.5,0 0,0 ; 0,0 0,-0.5 0,0 ; 0,0 -0.5,0 0,0 ; -1.65,-2.029 -1.65,-0.759 -0.89,-0.759 -0.89,-2.029 -1.65,-2.029 ; -1.65,0.761 -1.65,2.031 -0.89,2.031 -0.89,0.761 -1.65,0.761 ; 0.89,-2.029 0.89,-0.759 1.65,-0.759 1.65,-2.029 0.89,-2.029 ; 0.89,0.761 0.89,2.031 1.65,2.031 1.65,0.761 0.89,0.761
Mechanical 14:
  circle w0.1: c-0.35,1.4 r0.2
  lines w0.1: -1.905,-1.905 -1.905,1.905 1.905,1.905 1.905,-1.905 -1.905,-1.905
Mechanical 15:
  lines w0.1: -2.155,-2.279 -2.155,2.281 2.155,2.281 2.155,-2.279 -2.155,-2.279
3D body "IND_MINI-CIRCUITS_GU1604.stp": height 3.81, standoff 0, extent -1.905,-1.905 1.905,1.905